# Altium footprint library WARG.PcbLib: 73 footprints (part 1 of 5)
Each footprint in its own frame and in the unit in brackets; x right, y up, seen from the top. Pads: shape width x height; smd on the part's side, far side on the other; paste and mask are expansions set on the pad; w line width, h text height; cw(c..) or ccw(c..) is an arc to the next point about the centre after c.
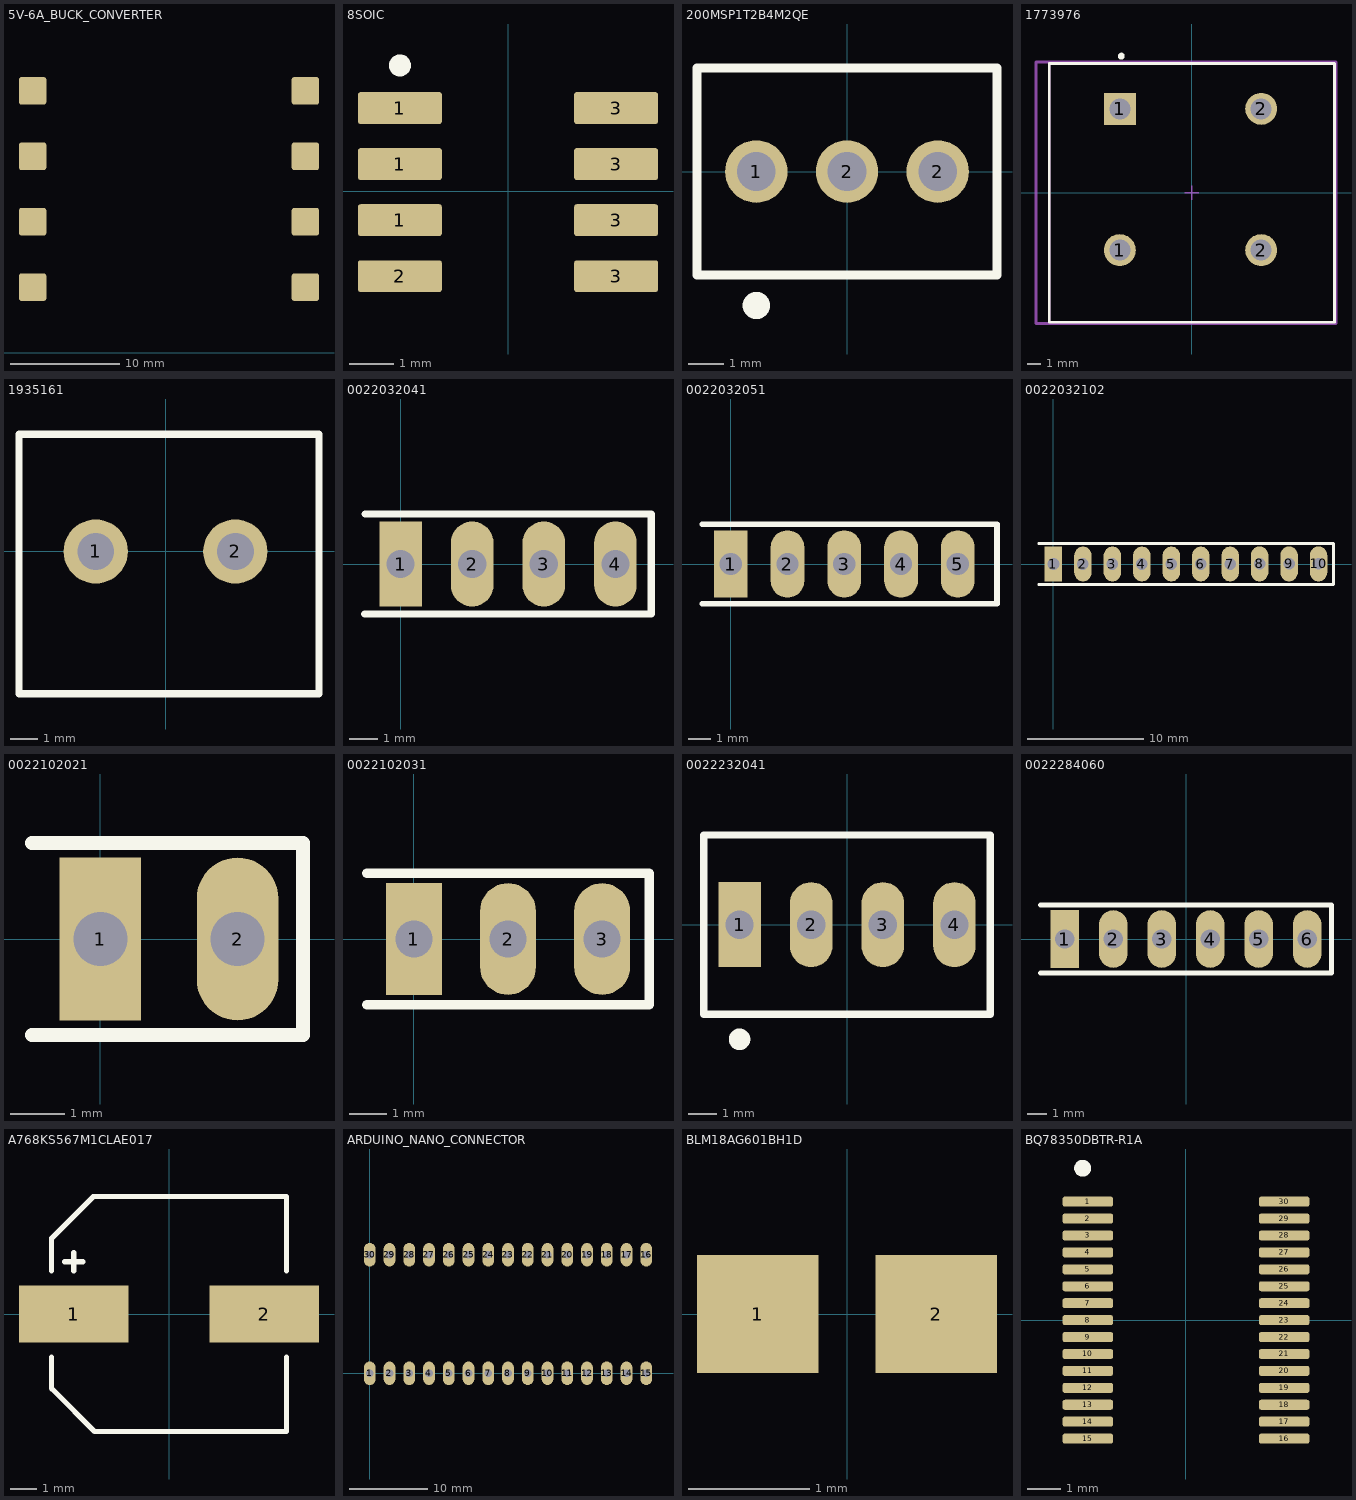
[diagram p0: the footprints below, top view; thin cyan lines are the x and y axes]

## 5V-6A_BUCK_CONVERTER [mm]
pads (8):
  rrect15% 2.5x2.5 smd: ""(3,6) ""(3,12) ""(3,18) ""(3,24) ""(28,6) ""(28,12) ""(28,18) ""(28,24)
3D body "Power Distribution.step": height 10.2, standoff -0.8, extent 3,0 28,30

## 8SOIC [mm] "MOSFET P-CH 30V 14A SO-8"
pads (8):
  rrect15% 1.9x0.72 smd: 1(-2.45,-0.656) 1(-2.45,0.614) 1(-2.45,1.884) 2(-2.45,-1.926) 3(2.45,-1.926) 3(2.45,-0.656) 3(2.45,0.614) 3(2.45,1.884)
Top Overlay:
  circle w0.25: c-2.45,2.85 r0.125
3D body "User Library-SOIC-8-1.step": height 1.75, standoff 0, extent -3,-2.45 3,2.45

## 200MSP1T2B4M2QE [mm] "SWITCH TOGGLE SPDT 3A 120V"
pads (3):
  round 1.75 hole 1.09: 1(-2.54,0) 2(0,0) 2(2.54,0)
Top Overlay:
  circle w0.508: c-2.54,-3.75 r0.127
  lines w0.254: -4.2,-2.9 -4.2,2.9 4.2,2.9 4.2,-2.9 -4.2,-2.9
3D body "200MSPxT2B4M2xE.stp": height 19.35, standoff -3.39, extent -4.065,-3 4.065,3

## 1773976 [mm]
pads (4):
  round 2.3 hole 1.5 paste-1000 mask+0: 1(-5.18,-4.12) 2(4.98,-4.12) 2(4.98,6.04)
  rect 2.3x2.3 hole 1.5 paste-1000 mask+0: 1(-5.18,6.04)
Top Overlay:
  circle w0.25: c-5.08,9.825 r0.125
  lines w0.2: -10.26,-9.3 10.26,-9.3 10.26,9.3 -10.26,9.3 -10.26,-9.3
Mechanical 10:
  lines w0.2: -11.21,-9.4 10.36,-9.4 10.36,9.4 -11.21,9.4 -11.21,-9.4
Mechanical 12:
  lines w0.2: -10.26,-9.3 10.26,-9.3 10.26,9.3 -10.26,9.3 -10.26,-9.3
Mechanical 15:
  lines w0.1: -0.5,0 0.5,0 ; 0,-0.5 0,0.5
  lines w0.2: -11.21,-9.4 10.36,-9.4 10.36,9.4 -11.21,9.4 -11.21,-9.4
3D body "Conn_Phoenix_Contact_1773976_eec.STEP": height 0.25, standoff 0, extent -11.21,-9.4 10.36,9.4

## 1935161 [mm] "TERM BLK 2POS SIDE ENTRY 5MM PCB"
pads (2):
  round 2.3 hole 1.325: 1(-2.5,0) 2(2.5,0)
Top Overlay:
  lines w0.254: -5.25,-5.1 -5.25,4.2 5.5,4.2 5.5,-5.1 -5.25,-5.1
3D body "1935161--3DModel-STEP-56544.STEP": height 11.41, standoff -3.49, extent -5.066,-4.936 5.334,4.064

## 0022032041 [mm] "Male 4 Pin Hdr Unshrouded"
pads (4):
  rect 1.508x3.016 hole 1: 1(0,0)
  oval 1.508x3.016 hole 1: 2(2.54,0) 3(5.08,0) 4(7.62,0)
Top Overlay:
  lines w0.254: -1.27,-1.778 8.89,-1.778 8.89,1.27 8.89,1.778 -1.25,1.778
3D body "0022032041.STEP": height 10.8, standoff -3.42, extent -1.145,-1.17 8.765,1.17

## 0022032051 [mm] "5 Pin Male Header"
pads (5):
  rect 1.508x3.016 hole 1: 1(0,0)
  oval 1.508x3.016 hole 1: 2(2.54,0) 3(5.08,0) 4(7.62,0) 5(10.16,0)
Top Overlay:
  lines w0.254: -1.27,-1.778 11.913,-1.778 11.913,1.753 ; -1.27,1.778 11.913,1.778
3D body "0022032051.STEP": height 10.8, standoff -3.42, extent -1.145,-1.17 11.305,1.17

## 0022032102 [mm] "10 Pin Male Header"
pads (10):
  rect 1.508x3.016 hole 1: 1(0,0)
  oval 1.508x3.016 hole 1: 2(2.54,0) 3(5.08,0) 4(7.62,0) 5(10.16,0) 6(12.7,0) 7(15.24,0) 8(17.775,0.005) 9(20.319,0.005) 10(22.855,0.005)
Top Overlay:
  lines w0.254: -1.27,-1.778 11.913,-1.778 24.13,-1.778 24.13,1.778 -1.27,1.778
3D body "0022032102.STEP": height 14.36, standoff -3.17, extent -1.145,-1.17 24.005,1.17

## 0022102021 [mm] "2 Pin Male Header"
pads (2):
  rect 1.508x3.016 hole 1: 1(0,0)
  oval 1.508x3.016 hole 1: 2(2.54,0)
Top Overlay:
  lines w0.254: -1.27,-1.778 3.75,-1.778 3.75,1.778 -1.27,1.778
3D body "0022102021.STEP": height 10.5, standoff -3.72, extent -1.145,-1.17 3.685,1.17

## 0022102031 [mm] "3 Pin Male Header"
pads (3):
  rect 1.508x3.016 hole 1: 1(0,0)
  oval 1.508x3.016 hole 1: 2(2.54,0) 3(5.08,0)
Top Overlay:
  lines w0.254: -1.27,-1.778 6.35,-1.778 6.35,1.778 -1.27,1.778
3D body "0022102031.STEP": height 10.8, standoff -3.42, extent -1.145,-1.17 6.225,1.17

## 0022232041 [mm]
pads (4):
  rect 1.508x3.016 hole 1: 1(-3.81,0)
  oval 1.508x3.016 hole 1: 2(-1.27,0) 3(1.27,0) 4(3.81,0)
Top Overlay:
  circle w0.508: c-3.81,-4.064 r0.127
  lines w0.254: -5.08,-3.175 -5.08,1.27 -5.08,3.175 5.08,3.175 5.08,1.27 5.08,-3.175 -5.08,-3.175
3D body "022232041.stp": height 10.68, standoff -3.54, extent -5.004,-3.099 5.004,3.251

## 0022284060 [mm] "6 Pin Male Header"
pads (6):
  rect 1.508x3.016 hole 1: 1(-6.35,0)
  oval 1.508x3.016 hole 1: 2(-3.81,0) 3(-1.27,0) 4(1.27,0) 5(3.81,0) 6(6.35,0)
Top Overlay:
  lines w0.254: -7.62,-1.778 5.563,-1.778 7.62,-1.778 7.62,1.778 -7.62,1.778
3D body "022284060.stp": height 8.39, standoff -3.16, extent -7.62,-1.245 7.62,1.245

## A768KS567M1CLAE017 [mm]
pads (2):
  rect 4.2x2.2 smd: 1(-3.65,0) 2(3.65,0)
Top Overlay:
  lines w0.2: -4.5,-1.65 -4.5,-2.45 -4.5,-2.85 -4.387,-2.963 -2.85,-4.5 4.5,-4.5 4.5,-1.65 ; -4.5,1.65 -4.5,2.5 -4.5,2.9 -2.9,4.5 4.5,4.5 4.5,1.65 ; -4,2 -3.3,2 ; -3.65,1.65 -3.65,2.35
3D body "User Library-ALU-F.STEP": height 10.2, standoff 0, extent -4.95,-4.15 4.95,4.15

## ARDUINO_NANO_CONNECTOR [mm] "2x15 pin headers"
pads (30):
  oval 1.508x3.016 hole 1: 1(0,0) 2(2.54,0) 3(5.08,0) 4(7.62,0) 5(10.16,0) 6(12.7,0) 7(15.24,0) 8(17.775,0.005) 9(20.319,0.005) 10(22.855,0.005) 11(25.395,0.005) 12(27.935,0.005) 13(30.475,0.005) 14(33.015,0.005) 15(35.555,0.005) 16(35.555,15.245) 17(33.015,15.245) 18(30.475,15.245) 19(27.935,15.245) 20(25.395,15.245) 21(22.855,15.245) 22(20.319,15.245) 23(17.775,15.245) 24(15.24,15.24) 25(12.7,15.24) 26(10.16,15.24) 27(7.62,15.24) 28(5.08,15.24) 29(2.54,15.24) 30(0,15.24)
3D body "Conn_Sullins_PPTC151LFBN-RC_eec.STEP": height 8.5, standoff -3.2, extent -1.525,-1.265 37.075,1.275
3D body "User Library-Arduino Nano 3_0.STEP": height 20.88, standoff 2.62, extent -3.82,-1.65 41.009,16.89
3D body "Conn_Sullins_PPTC151LFBN-RC_eec.STEP": height 8.5, standoff -3.2, extent -1.52,13.97 37.08,16.51

## BLM18AG601BH1D [mm]
pads (2):
  rect 1x0.97 smd: 1(-0.735,0) 2(0.735,0)
3D body "BLM18AG601SN1D.STEP": height 0.81, standoff 0.01, extent -0.8,-0.475 0.8,0.475

## BQ78350DBTR-R1A [mm]
pads (30):
  rrect50% 1.5x0.297 smd: 1(-2.9,3.5) 2(-2.9,3) 3(-2.9,2.5) 4(-2.9,2) 5(-2.9,1.5) 6(-2.9,1) 7(-2.9,0.5) 8(-2.9,0) 9(-2.9,-0.5) 10(-2.9,-1) 11(-2.9,-1.5) 12(-2.9,-2) 13(-2.9,-2.5) 14(-2.9,-3) 15(-2.9,-3.5) 16(2.9,-3.5) 17(2.9,-3) 18(2.9,-2.5) 19(2.9,-2) 20(2.9,-1.5) 21(2.9,-1) 22(2.9,-0.5) 23(2.9,0) 24(2.9,0.5) 25(2.9,1) 26(2.9,1.5) 27(2.9,2) 28(2.9,2.5) 29(2.9,3) 30(2.9,3.5)
Top Overlay:
  circle w0.25: c-3.054,4.487 r0.125
3D body "BQ7693003DBTR.stp": height 1.13, standoff 0, extent -3.2,-3.9 3.2,3.9